# Altium footprint library Connectors.PcbLib: 155 footprints (part 8 of 10)
Each footprint in its own frame and in the unit in brackets; x right, y up, seen from the top. Pads: shape width x height; smd on the part's side, far side on the other; paste and mask are expansions set on the pad; w line width, h text height; cw(c..) or ccw(c..) is an arc to the next point about the centre after c.
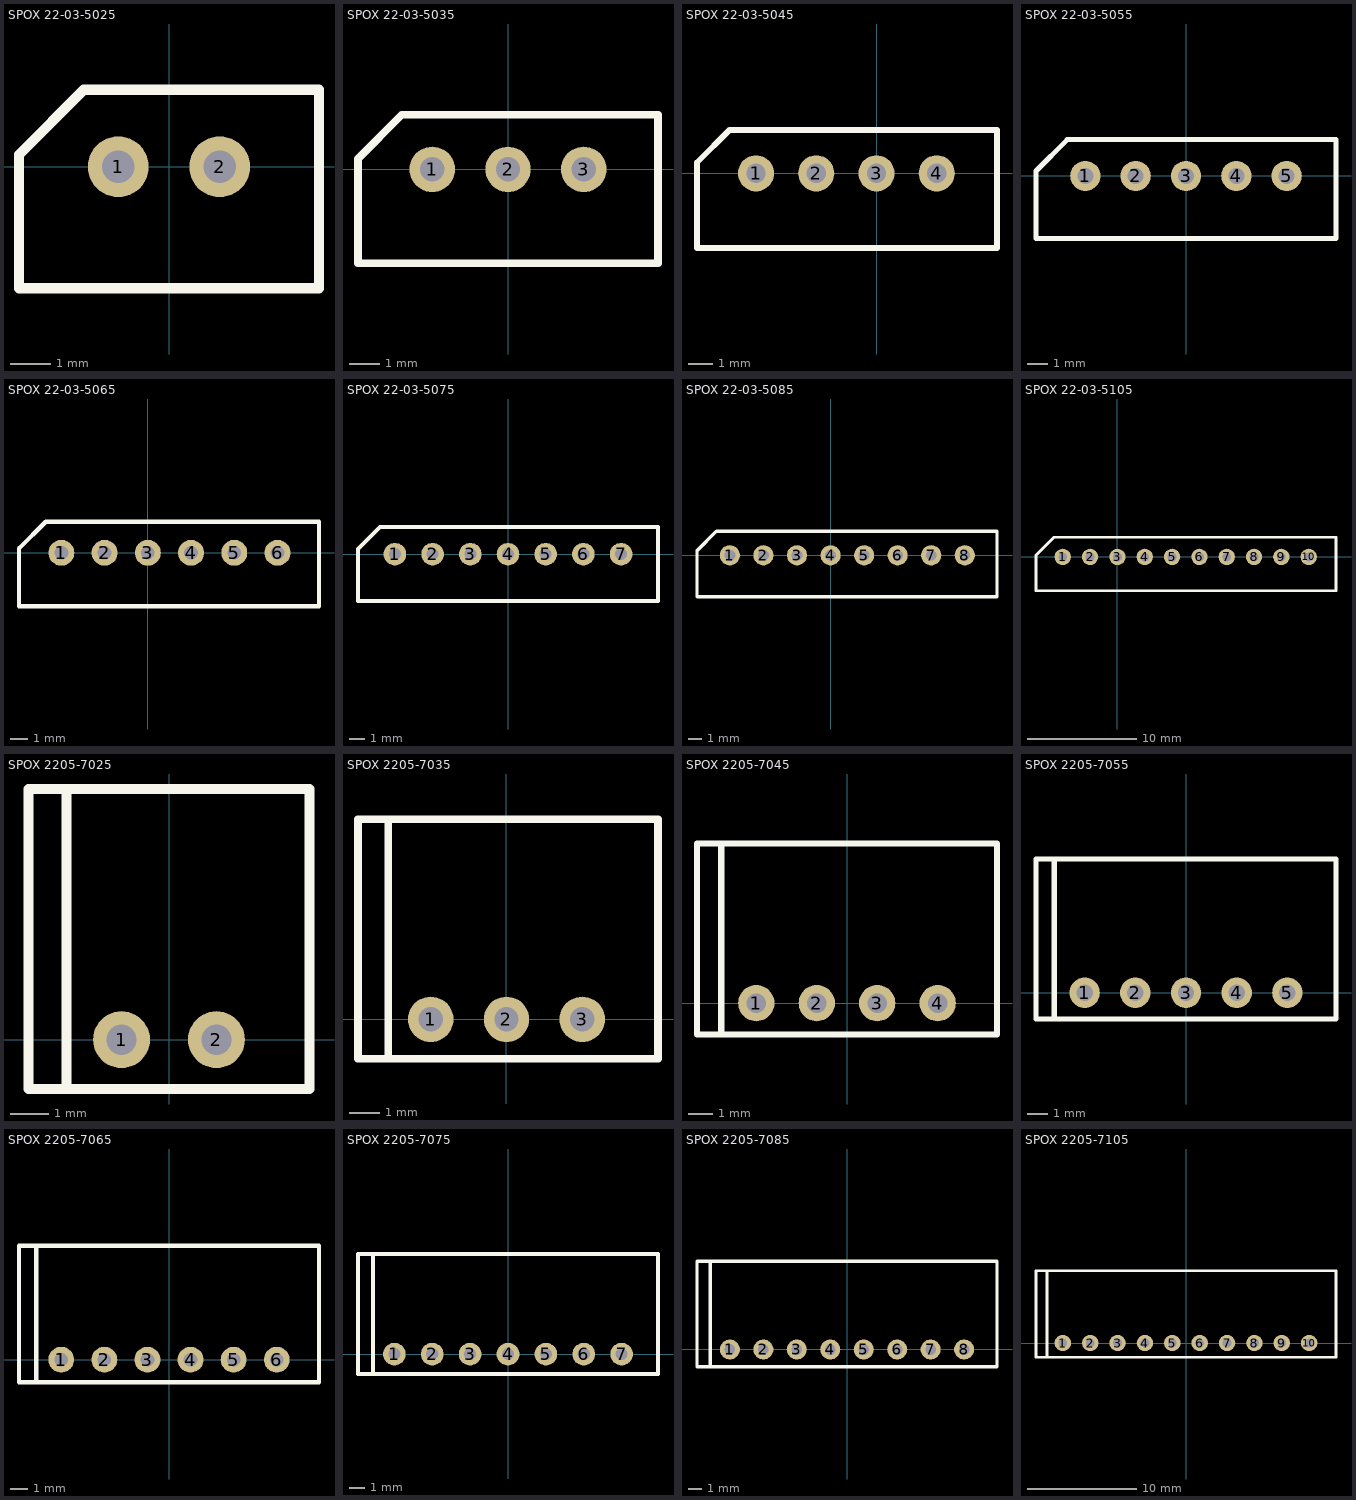
[diagram p7: the footprints below, top view; thin cyan lines are the x and y axes]

## SPOX 22-03-5025 [mm] "Connector"
height 5.9
pads (2):
  round 1.5 hole 0.8: 1(-1.25,0) 2(1.25,0)
Top Overlay:
  lines w0.254: -3.7,-3 -3.7,0.3 -2.1,1.9 3.7,1.9 3.7,-3 -3.7,-3
3D body: height 5.95, standoff -3.45, extent -3.7,-3.05 3.7,1.85

## SPOX 22-03-5035 [mm] "Connector"
height 5.9
pads (3):
  round 1.5 hole 0.8: 1(-2.5,0) 2(0,0) 3(2.5,0)
Top Overlay:
  lines w0.254: -4.95,-3.1 -4.95,0.35 -3.5,1.8 4.95,1.8 4.95,-3.1 -4.95,-3.1
3D body: height 5.95, standoff -3.45, extent -5.05,-3.1 4.85,1.8

## SPOX 22-03-5045 [mm] "SPOX 22-03-5045"
height 5.9
pads (4):
  round 1.5 hole 0.8: 1(-5,0) 2(-2.5,0) 3(0,0) 4(2.5,0)
Top Overlay:
  lines w0.254: -7.45,-3.1 5,-3.1 5,1.8 -6.1,1.8 -7.45,0.45 -7.45,-3.1
3D body: height 5.95, standoff -3.45, extent -7.5,-3.1 4.9,1.8

## SPOX 22-03-5055 [mm] "SPOX 22-03-5055"
height 5.9
pads (5):
  round 1.5 hole 0.8: 1(-5,0) 2(-2.5,0) 3(0,0) 4(2.5,0) 5(5,0)
Top Overlay:
  lines w0.254: -7.45,-3.1 7.45,-3.1 7.45,1.8 -5.9,1.8 -7.45,0.25 -7.45,-3.1
3D body: height 5.95, standoff -3.45, extent -7.4,-3.1 7.5,1.8

## SPOX 22-03-5065 [mm] "SPOX 22-03-5065"
height 5.9
pads (6):
  round 1.5 hole 0.8: 1(-5,0) 2(-2.5,0) 3(0,0) 4(2.5,0) 5(5,0) 6(7.5,0)
Top Overlay:
  lines w0.254: -7.45,-3.1 9.9,-3.1 9.9,1.8 -5.9,1.8 -7.45,0.25 -7.45,-3.1
3D body: height 5.95, standoff -3.45, extent -7.5,-3.1 9.9,1.8

## SPOX 22-03-5075 [mm] "SPOX 22-03-5075"
height 5.9
pads (7):
  round 1.5 hole 0.8: 1(-7.5,0) 2(-5,0) 3(-2.5,0) 4(0,0) 5(2.5,0) 6(5,0) 7(7.5,0)
Top Overlay:
  lines w0.254: -9.95,-3.1 -9.95,0.35 -8.5,1.8 9.95,1.8 9.95,-3.1 -9.95,-3.1
3D body: height 5.95, standoff -3.45, extent -10,-3.1 9.9,1.8

## SPOX 22-03-5085 [mm] "SPOX 22-03-5085"
height 5.9
pads (8):
  round 1.5 hole 0.8: 1(-7.5,0) 2(-5,0) 3(-2.5,0) 4(0,0) 5(2.5,0) 6(5,0) 7(7.5,0) 8(10,0)
Top Overlay:
  lines w0.254: -9.95,-3.1 -9.95,0.35 -8.5,1.8 12.4,1.8 12.4,-3.1 -9.95,-3.1
3D body: height 5.95, standoff -3.45, extent -10,-3.1 12.4,1.8

## SPOX 22-03-5105 [mm] "SPOX 22-03-5105"
height 5.9
pads (10):
  round 1.5 hole 0.8: 1(-5,0) 2(-2.5,0) 3(0,0) 4(2.5,0) 5(5,0) 6(7.5,0) 7(10,0) 8(12.5,0) 9(15,0) 10(17.5,0)
Top Overlay:
  lines w0.254: -7.45,-3.1 20,-3.1 20,1.8 -5.8,1.8 -7.45,0.15 -7.45,-3.1
3D body: height 5.95, standoff -3.45, extent -7.4,-3.2 20,1.7

## SPOX 2205-7025 [mm] "SPOX 2205-7025"
height 4.9
pads (2):
  round 1.5 hole 0.8: 1(-1.25,0) 2(1.25,0)
Top Overlay:
  lines w0.254: -2.7,-1.3 -2.7,6.6 ; -3.7,-1.3 -3.7,6.6 3.7,6.6 3.7,-1.3 -3.7,-1.3
3D body: height 4.95, standoff -3.45, extent -3.7,-1.3 3.7,6.6

## SPOX 2205-7035 [mm] "SPOX 2205-7035"
height 4.9
pads (3):
  round 1.5 hole 0.8: 1(-2.5,0) 2(0,0) 3(2.5,0)
Top Overlay:
  lines w0.254: -3.9,-1.3 -3.9,6.6 ; -4.9,-1.3 5,-1.3 5,6.6 -4.9,6.6 -4.9,-1.3
3D body: height 4.95, standoff -3.45, extent -4.9,-1.3 5,6.6

## SPOX 2205-7045 [mm] "SPOX 2205-7045"
height 4.9
pads (4):
  round 1.5 hole 0.8: 1(-3.75,0) 2(-1.25,0) 3(1.25,0) 4(3.75,0)
Top Overlay:
  lines w0.254: -5.2,-1.3 -5.2,6.6 ; -6.2,-1.3 6.2,-1.3 6.2,6.6 -6.2,6.6 -6.2,-1.3
3D body: height 4.95, standoff -3.45, extent -6.2,-1.3 6.2,6.6

## SPOX 2205-7055 [mm] "SPOX 2205-7055"
height 4.9
pads (5):
  round 1.5 hole 0.8: 1(-5,0) 2(-2.5,0) 3(0,0) 4(2.5,0) 5(5,0)
Top Overlay:
  lines w0.254: -6.5,-1.3 -6.5,6.6 ; -7.4,-1.3 -7.4,6.6 7.4,6.6 7.4,-1.3 -7.4,-1.3
3D body: height 4.95, standoff -3.45, extent -7.45,-1.3 7.45,6.6

## SPOX 2205-7065 [mm] "SPOX 2205-7065"
height 4.9
pads (6):
  round 1.5 hole 0.8: 1(-6.25,0) 2(-3.75,0) 3(-1.25,0) 4(1.25,0) 5(3.75,0) 6(6.25,0)
Top Overlay:
  lines w0.254: -7.7,-1.3 -7.7,6.6 ; -8.7,-1.3 8.7,-1.3 8.7,6.6 -8.7,6.6 -8.7,-1.3
3D body: height 4.95, standoff -3.45, extent -8.7,-1.3 8.7,6.6

## SPOX 2205-7075 [mm] "SPOX 2205-7075"
height 4.9
pads (7):
  round 1.5 hole 0.8: 1(-7.5,0) 2(-5,0) 3(-2.5,0) 4(0,0) 5(2.5,0) 6(5,0) 7(7.5,0)
Top Overlay:
  lines w0.254: -8.9,-1.3 -8.9,6.6 ; -9.9,-1.3 9.9,-1.3 9.9,6.6 -9.9,6.6 -9.9,-1.3
3D body: height 4.95, standoff -3.45, extent -9.95,-1.3 9.95,6.6

## SPOX 2205-7085 [mm] "SPOX 2205-7075"
height 4.9
pads (8):
  round 1.5 hole 0.8: 1(-8.75,0) 2(-6.25,0) 3(-3.75,0) 4(-1.25,0) 5(1.25,0) 6(3.75,0) 7(6.25,0) 8(8.75,0)
Top Overlay:
  lines w0.254: -10.2,-1.3 -10.2,6.6 ; -11.2,-1.3 11.2,-1.3 11.2,6.6 -11.2,6.6 -11.2,-1.3
3D body: height 4.95, standoff -3.45, extent -11.2,-1.3 11.2,6.6

## SPOX 2205-7105 [mm] "SPOX 2205-7075"
height 4.9
pads (10):
  round 1.5 hole 0.8: 1(-11.25,0) 2(-8.75,0) 3(-6.25,0) 4(-3.75,0) 5(-1.25,0) 6(1.25,0) 7(3.75,0) 8(6.25,0) 9(8.75,0) 10(11.25,0)
Top Overlay:
  lines w0.254: -12.7,-1.3 -12.7,6.6 ; -13.7,-1.3 -13.7,6.6 13.7,6.6 13.7,-1.3 -13.7,-1.3
3D body: height 4.95, standoff -3.45, extent -13.7,-1.3 13.7,6.6